# Altium footprint library asib.PcbLib: 45 footprints (part 2 of 3)
Each footprint in its own frame and in the unit in brackets; x right, y up, seen from the top. Pads: shape width x height; smd on the part's side, far side on the other; paste and mask are expansions set on the pad; w line width, h text height; cw(c..) or ccw(c..) is an arc to the next point about the centre after c.
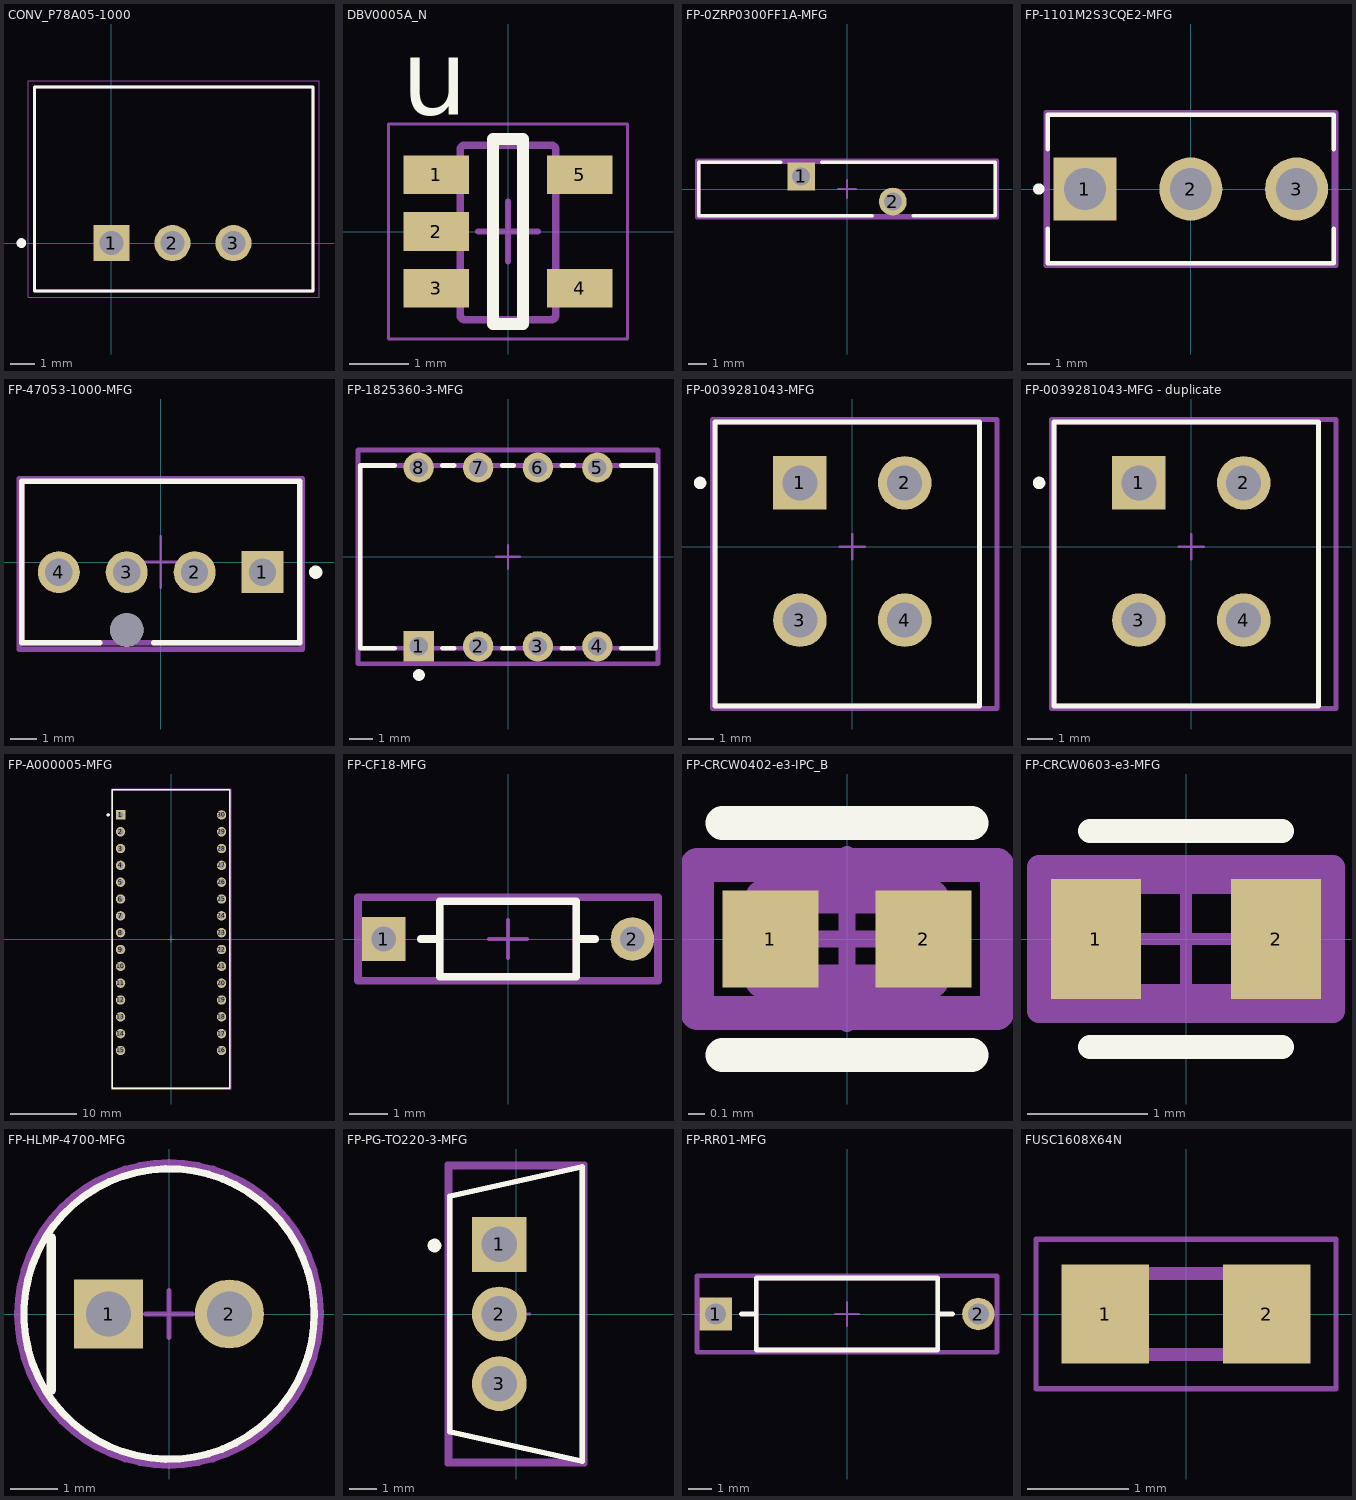
[diagram p1: the footprints below, top view; thin cyan lines are the x and y axes]

## CONV_P78A05-1000 [mm]
pads (3):
  rect 1.508x1.508 hole 1: 1(0,0)
  round 1.508 hole 1: 2(2.54,0) 3(5.08,0)
Top Overlay:
  circle w0.2: c-3.75,0 r0.1
  lines w0.127: -3.21,-2 8.39,-2 8.39,6.5 -3.21,6.5 -3.21,-2
Top 3D Body:
  circle w0.2: c-3.75,0 r0.1
  lines w0.127: -3.21,-2 -3.21,6.5 8.39,6.5 8.39,-2 -3.21,-2
Top Courtyard:
  lines w0.05: -3.46,-2.25 -3.46,6.75 8.64,6.75 8.64,-2.25 -3.46,-2.25

## DBV0005A_N [mm]
pads (5):
  rect 1.1x0.65 smd paste-0.102 mask+0.051: 1(-1.2,0.95) 2(-1.2,0) 3(-1.2,-0.95) 4(1.2,-0.95) 5(1.2,0.95)
Top Overlay:
  lines w0.2: -0.25,-1.55 0.25,-1.55 0.25,1.55 -0.25,1.55 -0.25,-1.55
  text "u" at -1.778,1.956 h1.27
Top 3D Body:
  lines w0.127: -0.801,1.371 cw(c-0.725,1.37) -0.725,1.446 ; -0.801,1.37 -0.801,-1.399 -0.801,-1.4 ccw(c-0.725,-1.399) -0.725,-1.475 ; -0.801,1.37 -0.801,1.371 ; -0.725,-1.475 -0.725,-1.475 ; -0.725,-1.475 0.723,-1.475 0.724,-1.475 ccw(c0.723,-1.399) 0.799,-1.4 0.799,-1.399 0.799,1.37 ; -0.725,1.446 0.723,1.446 0.724,1.446 cw(c0.723,1.37) 0.799,1.371 ; -0.725,1.446 -0.725,1.446 ; 0.799,1.37 0.799,1.371 ; -1.423,-1.167 -1.199,-1.167 -1.105,-1.167 -1.088,-1.167 -0.835,-1.167 -0.801,-1.167 -0.801,-0.767 -0.835,-0.767 -1.088,-0.767 -1.105,-0.767 -1.199,-0.767 -1.423,-0.767 -1.423,-1.167 ; -1.423,-0.215 -1.199,-0.215 -1.105,-0.215 -1.088,-0.215 -0.835,-0.215 -0.801,-0.215 -0.801,0.186 -0.835,0.186 -1.088,0.186 -1.105,0.186 -1.199,0.186 -1.423,0.186 -1.423,-0.215 ; -1.423,0.738 -1.199,0.738 -1.105,0.738 -1.088,0.738 -0.835,0.738 -0.801,0.738 -0.801,1.138 -0.835,1.138 -1.088,1.138 -1.105,1.138 -1.199,1.138 -1.423,1.138 -1.423,0.738 ; 0.799,-1.167 0.799,-0.767 0.834,-0.767 1.087,-0.767 1.103,-0.767 1.198,-0.767 1.422,-0.767 1.422,-1.167 1.198,-1.167 1.103,-1.167 1.087,-1.167 0.834,-1.167 0.799,-1.167 ; 0.799,0.738 0.799,1.138 0.834,1.138 1.087,1.138 1.103,1.138 1.198,1.138 1.422,1.138 1.422,0.738 1.198,0.738 1.103,0.738 1.087,0.738 0.834,0.738 0.799,0.738
Top Courtyard:
  lines w0.05: -2,-1.8 -2,1.8 2,1.8 2,-1.8 -2,-1.8
  lines w0.1: -0.5,0 0.5,0 ; 0,-0.5 0,0.5

## FP-0ZRP0300FF1A-MFG [mm]
pads (2):
  rect 1.55x1.55 hole 1 paste-2539.97 mask+0: 1(-2.55,0.7)
  round 1.55 hole 1 paste-2539.97 mask+0: 2(2.55,-0.7)
Top Overlay:
  lines w0.2: -3.7,1.5 -8.25,1.5 -8.25,-1.5 1.4,-1.5 ; -1.4,1.5 8.25,1.5 8.25,-1.5 3.7,-1.5
Top Assembly:
  lines w0.2: -8.35,-1.6 -8.35,1.6 8.35,1.6 8.35,-1.6 -8.35,-1.6
  text ".Designator" at 0,0.188 h1
Top 3D Body:
  lines w0.2: -8.25,-1.5 -8.25,1.5 8.25,1.5 8.25,-1.5 -8.25,-1.5
Top Courtyard:
  lines w0.2: -8.35,-1.6 -8.35,1.6 8.35,1.6 8.35,-1.6 -8.35,-1.6
Top Component Center:
  lines w0.1: -0.5,0 0.5,0 ; 0,-0.5 0,0.5
3D body "Fuse_Bel_Fuse_Inc_0ZRP0300FF1A_eec.STEP": height 0.25, standoff 0, extent -8.35,-1.6 8.35,1.6

## FP-1101M2S3CQE2-MFG [mm]
pads (3):
  rect 2.8x2.8 hole 1.85 paste-2539.97 mask+0: 1(-4.7,0)
  round 2.8 hole 1.85 paste-2539.97 mask+0: 2(0,0) 3(4.7,0)
Top Overlay:
  circle w0.25: c-6.75,0 r0.125
  lines w0.2: -6.35,-1.775 -6.35,-3.3 6.35,-3.3 6.35,-1.775 ; -6.35,1.775 -6.35,3.3 6.35,3.3 6.35,1.775
Top Assembly:
  lines w0.2: -6.45,-3.4 -6.45,3.4 6.45,3.4 6.45,-3.4 -6.45,-3.4
  text ".Designator" at 0,0 h1
Top 3D Body:
  lines w0.2: -6.35,-3.3 -6.35,3.3 6.35,3.3 6.35,-3.3 -6.35,-3.3
Top Courtyard:
  lines w0.2: -6.45,-3.4 -6.45,3.4 6.45,3.4 6.45,-3.4 -6.45,-3.4
Top Component Center:
  lines w0.1: -0.5,0 0.5,0 ; 0,-0.5 0,0.5
3D body "Switch_C&K_1101M2S3CQE2_eec.STEP": height 0.25, standoff 0, extent -6.45,-3.4 6.45,3.4

## FP-47053-1000-MFG [mm]
pads (5):
  rect 1.57x1.57 hole 1.02 paste-2539.97 mask+0: 1(3.81,-0.38)
  round 1.57 hole 1.02 paste-2539.97 mask+0: 2(1.27,-0.38) 3(-1.27,-0.38) 4(-3.81,-0.38)
  round 1.25 hole 1.25 unplated paste-2539.97 mask+0: ""(-1.27,-2.54)
Top Overlay:
  circle w0.25: c5.8,-0.38 r0.125
  lines w0.2: -2.27,-3.02 -5.2,-3.02 -5.2,3.02 5.2,3.02 5.2,-3.02 -0.27,-3.02
Top Assembly:
  lines w0.2: -5.3,-3.265 -5.3,3.12 5.3,3.12 5.3,-3.265 -5.3,-3.265
  text ".Designator" at 0,-0.072 h1
Top 3D Body:
  lines w0.2: -5.2,-3.02 -5.2,3.02 5.2,3.02 5.2,-3.02 -5.2,-3.02
Top Courtyard:
  lines w0.2: -5.3,-3.265 -5.3,3.12 5.3,3.12 5.3,-3.265 -5.3,-3.265
Top Component Center:
  lines w0.1: -0.958,0 0.958,0 ; 0,-0.958 0,0.958
3D body "Conn_Molex_47053-1000_eec.STEP": height 0.25, standoff 0, extent -5.3,-3.265 5.3,3.12

## FP-1825360-3-MFG [mm]
pads (8):
  rect 1.29x1.29 hole 0.79 paste-2539.97 mask+0: 1(-3.81,-3.81)
  round 1.29 hole 0.79 paste-2539.97 mask+0: 2(-1.27,-3.81) 3(1.27,-3.81) 4(3.81,-3.81) 5(3.81,3.81) 6(1.27,3.81) 7(-1.27,3.81) 8(-3.81,3.81)
Top Overlay:
  circle w0.25: c-3.795,-5.035 r0.125
  lines w0.2: -4.83,-3.9 -6.295,-3.9 -6.295,3.9 -4.83,3.9 ; -2.79,-3.9 -2.29,-3.9 ; -2.79,3.9 -2.29,3.9 ; -0.25,-3.9 0.25,-3.9 ; -0.25,3.9 0.25,3.9 ; 2.29,-3.9 2.79,-3.9 ; 2.29,3.9 2.79,3.9 ; 4.83,-3.9 6.295,-3.9 6.295,3.9 4.83,3.9
Top Assembly:
  lines w0.2: -6.395,-4.555 6.395,-4.555 6.395,4.555 -6.395,4.555 -6.395,-4.555
  text ".Designator" at 0,0 h1
Top 3D Body:
  lines w0.2: -6.295,-3.9 6.295,-3.9 6.295,3.9 -6.295,3.9 -6.295,-3.9
Top Courtyard:
  lines w0.2: -6.395,-4.555 6.395,-4.555 6.395,4.555 -6.395,4.555 -6.395,-4.555
Top Component Center:
  lines w0.1: -0.5,0 0.5,0 ; 0,-0.5 0,0.5
3D body "Switch_TE_Connectivity_1825360-3_eec.STEP": height 0.25, standoff 0, extent -6.395,-4.555 6.395,4.555

## FP-0039281043-MFG [mm]
pads (4):
  rect 2.15x2.15 hole 1.4 paste-2539.97 mask+0: 1(-2.1,2.55)
  round 2.15 hole 1.4 paste-2539.97 mask+0: 2(2.1,2.55) 3(-2.1,-2.95) 4(2.1,-2.95)
Top Overlay:
  circle w0.25: c-6.1,2.55 r0.125
  lines w0.2: -5.5,-6.4 5.1,-6.4 5.1,5 -5.5,5 -5.5,-6.4
Top Assembly:
  lines w0.2: -5.6,-6.5 5.8,-6.5 5.8,5.1 -5.6,5.1 -5.6,-6.5
  text ".Designator" at 0.1,-0.512 h1
Top 3D Body:
  lines w0.2: -5.5,-6.4 5.1,-6.4 5.1,5 -5.5,5 -5.5,-6.4
Top Courtyard:
  lines w0.2: -5.6,-6.5 5.8,-6.5 5.8,5.1 -5.6,5.1 -5.6,-6.5
Top Component Center:
  lines w0.1: -0.5,0 0.5,0 ; 0,-0.5 0,0.5
3D body "Conn_Molex_0039281043_eec.STEP": height 0.25, standoff 0, extent -5.6,-6.5 5.8,5.1

## FP-0039281043-MFG - duplicate [mm]
pads (4):
  rect 2.15x2.15 hole 1.4 paste-2539.97 mask+0: 1(-2.1,2.55)
  round 2.15 hole 1.4 paste-2539.97 mask+0: 2(2.1,2.55) 3(-2.1,-2.95) 4(2.1,-2.95)
Top Overlay:
  circle w0.25: c-6.1,2.55 r0.125
  lines w0.2: -5.5,-6.4 -5.5,5 5.1,5 5.1,-6.4 -5.5,-6.4
Top Assembly:
  lines w0.2: -5.6,-6.5 -5.6,5.1 5.8,5.1 5.8,-6.5 -5.6,-6.5
  text ".Designator" at 0.1,-0.512 h1
Top 3D Body:
  lines w0.2: -5.5,-6.4 -5.5,5 5.1,5 5.1,-6.4 -5.5,-6.4
Top Courtyard:
  lines w0.2: -5.6,-6.5 -5.6,5.1 5.8,5.1 5.8,-6.5 -5.6,-6.5
Top Component Center:
  lines w0.1: -0.5,0 0.5,0 ; 0,-0.5 0,0.5
3D body "Conn_Molex_0039281043_eec.STEP": height 0.25, standoff 0, extent -5.6,-6.5 5.8,5.1

## FP-A000005-MFG [mil]
pads (30):
  rect 55.67x55.67 hole 35.98 paste-99999 mask+0: 1(-300,737.5)
  round 55.67 hole 35.98 paste-99999 mask+0: 2(-300,637.5) 3(-300,537.5) 4(-300,437.5) 5(-300,337.5) 6(-300,237.5) 7(-300,137.5) 8(-300,37.5) 9(-300,-62.5) 10(-300,-162.5) 11(-300,-262.5) 12(-300,-362.5) 13(-300,-462.5) 14(-300,-562.5) 15(-300,-662.5) 16(300,-662.5) 17(300,-562.5) 18(300,-462.5) 19(300,-362.5) 20(300,-262.5) 21(300,-162.5) 22(300,-62.5) 23(300,37.5) 24(300,137.5) 25(300,237.5) 26(300,337.5) 27(300,437.5) 28(300,537.5) 29(300,637.5) 30(300,737.5)
Top Overlay:
  circle w9.84: c-373.62,737.5 r4.92
  lines w7.87: -350,-887.5 -350,887.5 350,887.5 350,-887.5 -350,-887.5
Top Assembly:
  lines w7.87: -353.94,-891.44 -353.94,891.44 353.94,891.44 353.94,-891.44 -353.94,-891.44
  text ".Designator" at 0,0 h39.37
Top 3D Body:
  lines w7.87: -350,-887.5 -350,887.5 350,887.5 350,-887.5 -350,-887.5
Top Courtyard:
  lines w7.87: -353.94,-891.44 -353.94,891.44 353.94,891.44 353.94,-891.44 -353.94,-891.44
Top Component Center:
  lines w3.94: -19.68,0 19.68,0 ; 0,-19.68 0,19.68
3D body "UNK_Arduino_A000005_eec.STEP": height 10, standoff 0, extent -353.94,-891.44 353.94,891.44

## FP-CF18-MFG [mm]
pads (2):
  rect 1.15x1.15 hole 0.65 paste-2539.97 mask+0: 1(-3.28,0)
  round 1.15 hole 0.65 paste-2539.97 mask+0: 2(3.28,0)
Top Overlay:
  lines w0.2: -2.305,0 -1.8,0 ; 1.8,0 2.305,0 ; -1.8,-1 1.8,-1 1.8,1 -1.8,1 -1.8,-1
Top Assembly:
  lines w0.2: -3.955,-1.1 3.955,-1.1 3.955,1.1 -3.955,1.1 -3.955,-1.1
  text ".Designator" at 0,0.188 h1
Top 3D Body:
  lines w0.2: -1.8,-1 1.8,-1 1.8,1 -1.8,1 -1.8,-1
Top Courtyard:
  lines w0.2: -3.955,-1.1 3.955,-1.1 3.955,1.1 -3.955,1.1 -3.955,-1.1
Top Component Center:
  lines w0.1: -0.5,0 0.5,0 ; 0,-0.5 0,0.5
3D body "Res_Stackpole_Electronics_CF18JT10K0_eec.STEP": height 0.25, standoff 0, extent -3.955,-1.1 3.955,1.1

## FP-CRCW0402-e3-IPC_B [mm]
pads (2):
  rect 0.568x0.572 smd paste+0 mask+0: 1(-0.452,0) 2(0.452,0)
Top Overlay:
  lines w0.2: -0.736,-0.686 0.736,-0.686 ; -0.736,0.686 0.736,0.686
Top Assembly:
  lines w0.2: -0.886,-0.436 -0.886,0.436 0.886,0.436 0.886,-0.436 -0.886,-0.436
  text ".Designator" at 0,0.188 h1
Top 3D Body:
  lines w0.2: -0.5,-0.25 -0.5,0.25 0.5,0.25 0.5,-0.25 -0.5,-0.25
Top Courtyard:
  lines w0.2: -0.886,-0.436 -0.886,0.436 0.886,0.436 0.886,-0.436 -0.886,-0.436
Top Component Center:
  lines w0.1: -0.5,0 0.5,0 ; 0,-0.5 0,0.5
3D body "Res_Vishay_CRCW04021K00FKED_eec.STEP": height 0.25, standoff 0, extent -0.886,-0.436 0.886,0.436

## FP-CRCW0603-e3-MFG [mm]
pads (2):
  rect 0.75x1 smd paste+0 mask+0: 1(-0.75,0) 2(0.75,0)
Top Overlay:
  lines w0.2: -0.8,-0.9 0.8,-0.9 ; -0.8,0.9 0.8,0.9
Top Assembly:
  lines w0.2: -1.225,-0.6 1.225,-0.6 1.225,0.6 -1.225,0.6 -1.225,-0.6
  text ".Designator" at 0,0.188 h1
Top 3D Body:
  lines w0.2: -0.825,-0.475 0.825,-0.475 0.825,0.475 -0.825,0.475 -0.825,-0.475
Top Courtyard:
  lines w0.2: -1.225,-0.6 1.225,-0.6 1.225,0.6 -1.225,0.6 -1.225,-0.6
Top Component Center:
  lines w0.1: -0.5,0 0.5,0 ; 0,-0.5 0,0.5
3D body "Res_Vishay_CRCW06033M90FKEC_eec.STEP": height 0.25, standoff 0, extent -1.225,-0.6 1.225,0.6

## FP-HLMP-4700-MFG [mm]
pads (2):
  rect 1.45x1.45 hole 0.95 paste-2539.97 mask+0: 1(-1.27,0)
  round 1.45 hole 0.95 paste-2539.97 mask+0: 2(1.27,0)
Top Overlay:
  circle w0.15: c0,0 r3.05
  lines w0.2: -2.475,-1.6 -2.475,1.6
Top Assembly:
  text ".Designator" at 0,0.188 h1
Top 3D Body:
  circle w0.15: c0,0 r3.05
Top Courtyard:
  lines w0.2: -3.15,0 ccw(c0,0) 3.15,0 ccw(c0,0) -3.15,0
Top Component Center:
  lines w0.1: -0.5,0 0.5,0 ; 0,-0.5 0,0.5
3D body "Diode_Broadcom_HLMP-4700_eec.STEP": height 0.25, standoff 0, extent -3.15,-3.15 3.15,3.15

## FP-PG-TO220-3-MFG [mm]
pads (3):
  rect 2x2 hole 1.3 paste-2539.97 mask+0: 1(-0.61,2.54)
  round 2 hole 1.3 paste-2539.97 mask+0: 2(-0.61,0) 3(-0.61,-2.54)
Top Overlay:
  circle w0.25: c-2.975,2.5 r0.125
  lines w0.2: 2.415,-5.375 -2.415,-4.3 -2.415,4.3 2.415,5.375 ; 2.415,-5.325 2.415,5.325
Top Assembly:
  lines w0.2: -2.515,-5.475 2.515,-5.475 2.515,5.475 -2.515,5.475 -2.515,-5.475
  text ".Designator" at 0,0 h1
Top 3D Body:
  lines w0.2: -2.415,-5.375 2.415,-5.375 2.415,5.375 -2.415,5.375 -2.415,-5.375
Top Courtyard:
  lines w0.2: -2.515,-5.475 2.515,-5.475 2.515,5.475 -2.515,5.475 -2.515,-5.475
Top Component Center:
  lines w0.1: -0.5,0 0.5,0 ; 0,-0.5 0,0.5
3D body "Trans_Infineon_IRLB4132PBF_eec.STEP": height 0.25, standoff 0, extent -2.515,-5.475 2.515,5.475

## FP-RR01-MFG [mm]
pads (2):
  rect 1.4x1.4 hole 0.9 paste-2539.97 mask+0: 1(-5.65,0)
  round 1.4 hole 0.9 paste-2539.97 mask+0: 2(5.65,0)
Top Overlay:
  lines w0.2: -4.55,0 -3.9,0 ; 3.9,0 4.55,0 ; -3.9,-1.55 3.9,-1.55 3.9,1.55 -3.9,1.55 -3.9,-1.55
Top Assembly:
  lines w0.2: -6.45,-1.65 6.45,-1.65 6.45,1.65 -6.45,1.65 -6.45,-1.65
  text ".Designator" at 0,0.188 h1
Top 3D Body:
  lines w0.2: -3.9,-1.55 3.9,-1.55 3.9,1.55 -3.9,1.55 -3.9,-1.55
Top Courtyard:
  lines w0.2: -6.45,-1.65 6.45,-1.65 6.45,1.65 -6.45,1.65 -6.45,-1.65
Top Component Center:
  lines w0.1: -0.5,0 0.5,0 ; 0,-0.5 0,0.5
3D body "Res_TE_Connectivity_RR01J100RTB_eec.STEP": height 0.25, standoff 0, extent -6.45,-1.65 6.45,1.65

## FUSC1608X64N [mm]
pads (2):
  rect 0.87x0.98 smd: 1(-0.8,0) 2(0.8,0)
Top 3D Body:
  lines w0.127: -0.8,-0.4 0.8,-0.4 0.8,0.4 -0.8,0.4 -0.8,-0.4
Top Courtyard:
  lines w0.05: -1.485,-0.74 1.485,-0.74 1.485,0.74 -1.485,0.74 -1.485,-0.74
3D body "step_temp.STEP": height 0.64, standoff 0, extent -0.8,-0.4 0.8,0.4